# Altium footprint library Relay.PcbLib: 60 footprints (part 2 of 4)
Each footprint in its own frame and in the unit in brackets; x right, y up, seen from the top. Pads: shape width x height; smd on the part's side, far side on the other; paste and mask are expansions set on the pad; w line width, h text height; cw(c..) or ccw(c..) is an arc to the next point about the centre after c.
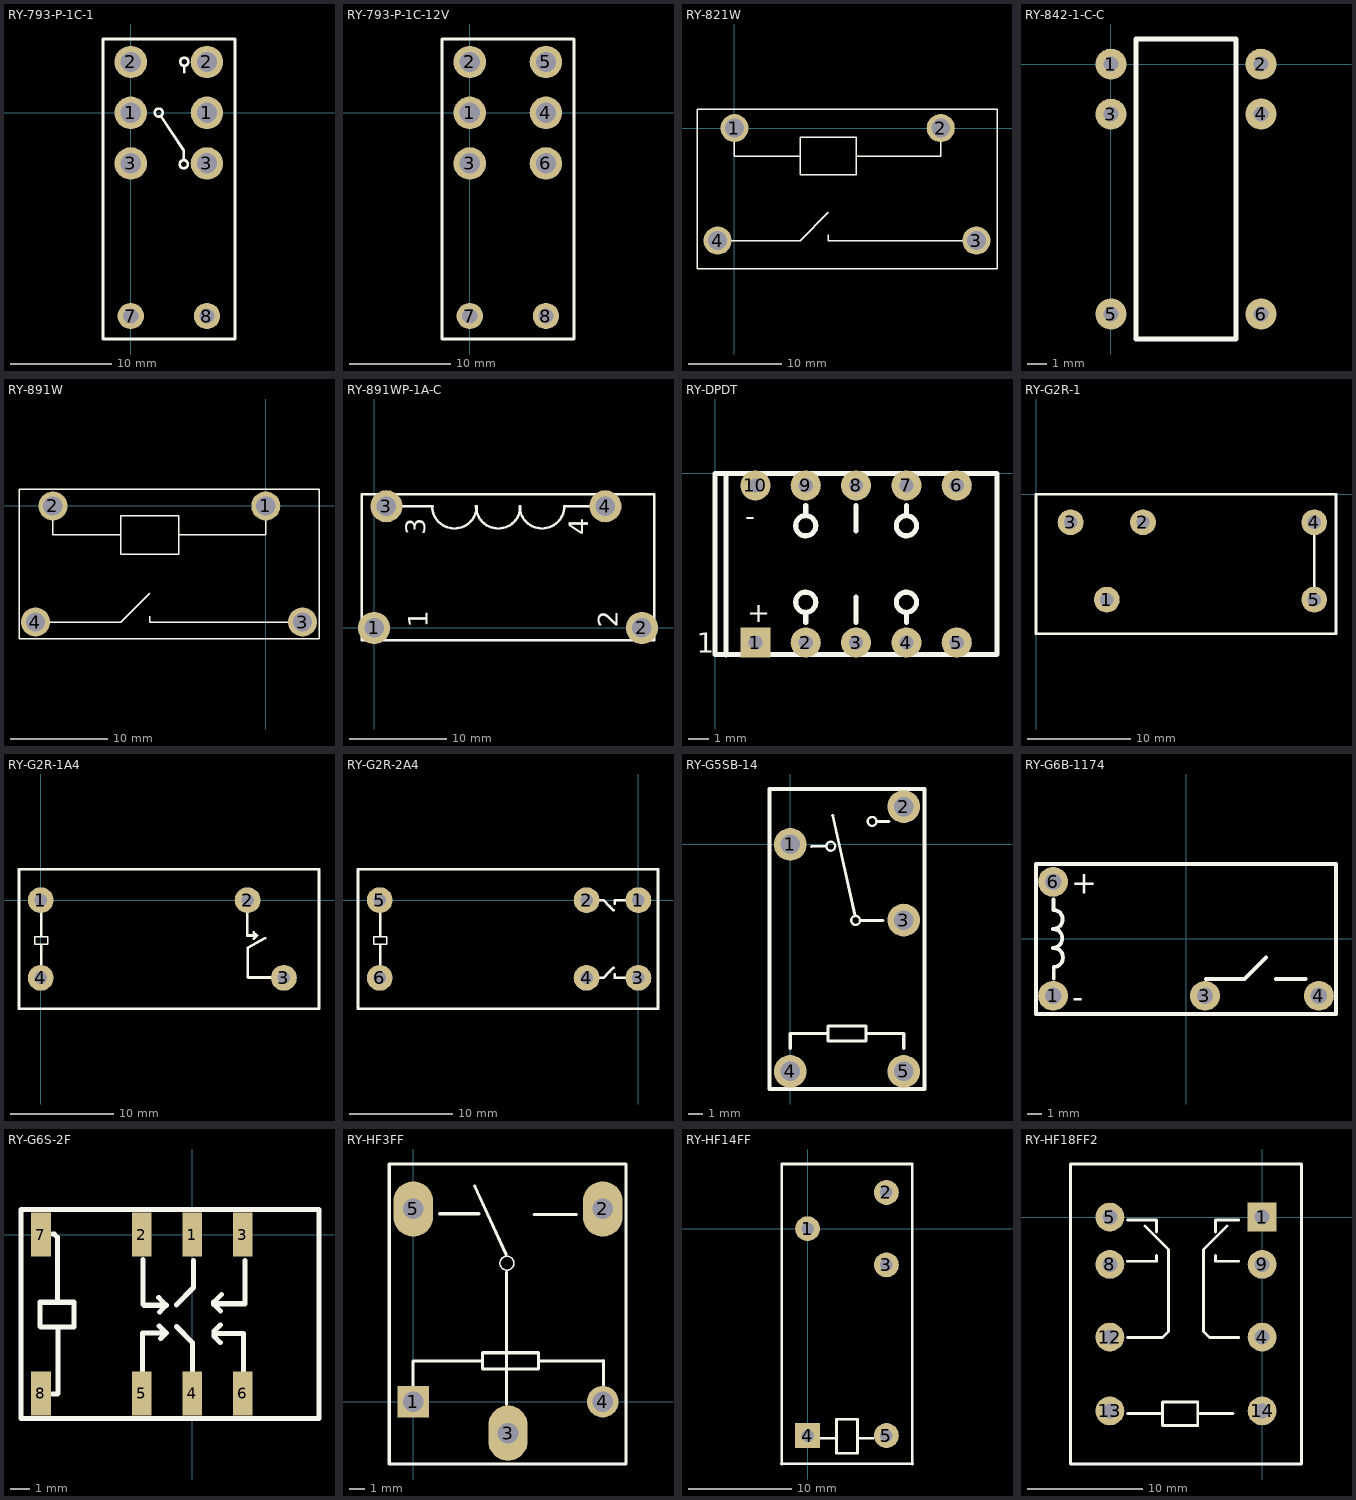
[diagram p1: the footprints below, top view; thin cyan lines are the x and y axes]

## RY-793-P-1C-1 [mil]
pads (8):
  round 126 hole 79: 1(0,0) 1(295,0) 2(0,197) 2(295,197) 3(0,-196) 3(295,-196)
  round 102 hole 59: 7(0,-787) 8(295,-787)
Top Overlay:
  circle w10: c205.35,-199 r15.65
  circle w10: c108.35,1 r15.65
  circle w10: c207.35,198 r15.65
  lines w10: 119,-16 205,-146 205,-176 ; 207,157 207,178
  lines w12: -108,-876 404,-876 404,286 -108,286 -108,-876

## RY-793-P-1C-12V [mil]
pads (8):
  round 126 hole 79: 1(0,0) 2(0,197) 3(0,-196) 4(295,0) 5(295,197) 6(295,-196)
  round 102 hole 59: 7(0,-787) 8(295,-787)
Top Overlay:
  lines w12: -108,-876 -108,286 404,286 404,-876 -108,-876

## RY-821W [mm]
pads (4):
  round 3 hole 2: 1(0,0) 2(22,0) 3(25.8,-12) 4(-1.8,-12)
Top Overlay:
  lines w0.15: -1.8,-12 7,-12 10,-9 ; 0,0 0,-3 7,-3 ; 10,-11.4 10,-12 25.8,-12 ; 13,-3 22,-3 22,0 ; 7,-3 7,-1 13,-1 13,-5 7,-5 7,-3 ; -4,-15 28,-15 28,2 -4,2 -4,-15

## RY-842-1-C-C [mil]
pads (6):
  round 62 hole 30: 1(0,0) 2(300,0) 3(0,-100) 4(300.3,-99.7) 5(0.3,-499.7) 6(300.3,-499.7)
Top Overlay:
  lines w10: 50.3,-549.7 50.3,50.3 250.3,50.3 250.3,-549.7 50.3,-549.7

## RY-891W [mm]
pads (4):
  round 3 hole 2: 1(0,0) 2(-22,0) 3(3.8,-12) 4(-23.8,-12)
Top Overlay:
  lines w0.15: -23.8,-12 -15,-12 -12,-9 ; -22,0 -22,-3 -15,-3 ; -12,-11.4 -12,-12 3.8,-12 ; -9,-3 0,-3 0,0 ; -15,-3 -15,-1 -9,-1 -9,-5 -15,-5 -15,-3 ; -25.5,-13.75 5.5,-13.75 5.5,1.75 -25.5,1.75 -25.5,-13.75

## RY-891WP-1A-C [mil]
pads (4):
  round 130 hole 79: 1(0,0) 2(1083,0) 3(50,492) 4(935,492)
Top Overlay:
  lines w10: 50,492 237,492 ; 235,492 ccw(c325,492) 415,492 ; 412,492 ccw(c502,492) 592,492 ; 589,492 ccw(c679,492) 769,492 ; 768,492 935,492 ; -49,-49 -49,541 1132,541 1132,-49 -49,-49
  text "3" at 207,374 h79
  text "4" at 866,374 h79
  text "1" at 217,0 h79
  text "2" at 985,0 h79

## RY-DPDT [mm]
pads (10):
  rect 1.5x1.5 hole 0.7: 1(2,-8.4)
  round 1.5 hole 0.7: 2(4.5,-8.4) 3(7,-8.4) 4(9.5,-8.4) 5(12,-8.4) 6(12,-0.6) 7(9.5,-0.6) 8(7,-0.6) 9(4.5,-0.6) 10(2,-0.6)
Top Overlay:
  circle w0.254: c4.5,-2.6 r0.5
  circle w0.254: c9.5,-2.6 r0.5
  circle w0.254: c4.5,-6.4 r0.5
  circle w0.254: c9.5,-6.4 r0.5
  lines w0.254: 0.533,-9.017 0.533,-0.025 ; 4.5,-7.4 4.5,-6.9 ; 4.5,-2.1 4.5,-1.6 ; 7,-7.4 7,-6.15 ; 7,-2.85 7,-1.6 ; 9.5,-7.4 9.5,-6.9 ; 9.5,-2.1 9.5,-1.6 ; 0,-9 0,0 14,0 14,-9 0,-9
  text "+" at 1.6,-7.4 h1
  text "-" at 1.5,-2.6 h1
  text "1" at -0.9,-8.9 h1
3D body: height 5, standoff 0, extent 0,-9 14,0

## RY-G2R-1 [mm]
pads (5):
  round 2.5 hole 1.3: 1(6.858,-10.211) 2(10.363,-2.718) 3(3.353,-2.718) 4(26.949,-2.718) 5(26.949,-10.211)
Top Overlay:
  lines w0.254: 26.949,-10.211 26.949,-2.718 ; 0,-13.513 0,0 29.058,0 29.058,-13.513 0,-13.513
3D body "relay_g2rk-1_48dc.stp": height 25.5, standoff -4, extent 0.079,-13.583 29.08,-0.083

## RY-G2R-1A4 [mm]
pads (4):
  round 2.5 hole 1.2: 1(0,0) 2(20,0) 3(23.5,-7.5) 4(0,-7.5)
Top Overlay:
  lines w0.127: 0.059,-5.395 0.059,-4.277 ; 0.059,-3.515 0.059,-2.855 ; -0.601,-4.277 0.669,-4.277 0.669,-3.515 -0.601,-3.515 -0.601,-4.277
  lines w0.254: 0.059,-7.441 0.059,-4.556 ; 0.059,-4.785 0.059,-4.353 ; 0.059,-3.439 0.059,-2.855 0.059,-0.059 ; 19.976,0.025 19.976,-2.959 19.976,-3.417 20.909,-3.417 ; 20.582,-3.744 20.909,-3.417 ; 20.582,-3.109 20.89,-3.417 20.909,-3.417 ; 21.674,-3.667 19.998,-4.607 19.998,-7.427 20.046,-7.475 23.476,-7.475 ; -2.1,-10.5 -2.1,3 26.9,3 26.9,-10.5 -2.1,-10.5

## RY-G2R-2A4 [mm]
pads (6):
  round 2.5 hole 1.2: 1(0,0) 2(-5,0) 3(0,-7.5) 4(-5,-7.5) 5(-25,0) 6(-25,-7.5)
Top Overlay:
  lines w0.127: -24.941,-5.395 -24.941,-4.277 ; -24.941,-3.515 -24.941,-2.855 ; -25.601,-4.277 -24.331,-4.277 -24.331,-3.515 -25.601,-3.515 -25.601,-4.277
  lines w0.254: -24.941,-7.441 -24.941,-4.556 ; -24.941,-4.785 -24.941,-4.353 ; -24.941,-3.439 -24.941,-2.855 -24.941,-0.059 ; -5,-7.5 -3.361,-7.5 -2.767,-6.906 -2.386,-6.525 ; -5,0 -3.361,0 -2.767,-0.594 -2.386,-0.975 ; -2.274,-7.15 -2.274,-7.5 0,-7.5 ; -2.274,-0.35 -2.274,0 0,0 ; -27.1,-10.5 -27.1,3 1.9,3 1.9,-10.5 -27.1,-10.5

## RY-G5SB-14 [mm]
pads (5):
  round 2.2 hole 1.3: 1(0,0) 2(7.62,2.54) 3(7.62,-5.08) 4(0,-15.24) 5(7.62,-15.24)
Top Overlay:
  circle w0.15: c4.391,-5.102 r0.3
  circle w0.15: c5.496,1.542 r0.3
  circle w0.15: c2.717,-0.122 r0.3
  lines w0.203: 0,-13.716 0,-12.7 2.54,-12.7 ; 1.439,-0.126 2.417,-0.122 ; 2.854,1.935 4.351,-4.779 ; 4.691,-5.102 6.215,-5.102 ; 5.08,-12.7 7.62,-12.7 7.62,-13.716 ; 5.796,1.542 6.627,1.539 ; 2.54,-13.208 3.556,-13.208 5.08,-13.208 5.08,-12.192 2.54,-12.192 2.54,-13.208
  lines w0.254: -1.39,-16.42 9.01,-16.42 9.01,3.72 -1.39,3.72 -1.39,-16.42

## RY-G6B-1174 [mm]
pads (4):
  round 2 hole 1.1: 1(-8.89,-3.81) 3(1.27,-3.81) 4(8.89,-3.81) 6(-8.89,3.81)
Top Overlay:
  lines w0.254: -8.915,-0.61 ccw(c-8.915,0.025) -8.28,0.025 -8.28,0.051 ccw(c-8.89,0.051) -8.89,0.66 ccw(c-8.89,1.295) -8.255,1.295 -8.255,1.321 ccw(c-8.865,1.321) -8.865,1.93 -8.865,2.642 ; -8.865,-0.61 cw(c-8.865,-1.245) -8.23,-1.245 -8.23,-1.27 cw(c-8.839,-1.27) -8.839,-1.88 -8.839,-2.667 ; 1.346,-2.692 3.912,-2.692 5.359,-1.245 ; 6.02,-2.692 8.001,-2.692 ; -10.033,-5.029 10.033,-5.029 10.033,5.004 -10.033,5.004 -10.033,-5.029
  text "+" at -7.671,3.023 h1.52
  text "-" at -7.62,-4.648 h1.52
3D body "g6b-1114p-us_5dc.stp": height 10, standoff -3.2, extent -10.474,-5 10.526,5

## RY-G6S-2F [mm]
pads (8):
  rect 1x2.2 smd: 1(0,0) 2(-2.54,0) 3(2.54,0) 4(0,-8) 5(-2.54,-8) 6(2.54,-8) 7(-7.62,0) 8(-7.62,-8)
Top Overlay:
  lines w0.254: -7.045,-8.031 -6.791,-8.031 -6.766,-8.005 -6.766,-7.548 -6.766,-4.653 ; -7.045,0.021 -6.944,0.021 -6.791,-0.131 -6.791,-3.357 ; -2.499,-6.862 -2.499,-4.957 -1.305,-4.957 ; -2.473,-1.249 -2.473,-3.51 -2.422,-3.56 -1.305,-3.56 ; -1.686,-3.179 -1.305,-3.56 ; -1.66,-4.602 -1.305,-4.957 ; -1.635,-3.891 -1.305,-3.56 ; -1.584,-5.237 -1.305,-4.957 ; -0.797,-4.627 0.016,-5.44 0.016,-6.862 ; -0.797,-3.535 0.067,-2.671 0.067,-1.3 ; 1.413,-5.44 1.108,-5.135 1.108,-4.983 ; 1.413,-4.551 1.108,-4.856 1.108,-4.983 ; 1.413,-3.84 1.083,-3.51 1.083,-3.484 ; 1.464,-3.027 1.083,-3.408 1.083,-3.484 ; 2.581,-6.862 2.581,-4.983 1.108,-4.983 ; 2.658,-1.3 2.658,-3.484 1.083,-3.484 ; -8.62,-9.25 6.38,-9.25 6.38,1.25 -8.62,1.25 -8.62,-9.25 ; -7.655,-4.627 -7.629,-4.653 -5.953,-4.653 -5.953,-3.408 -7.655,-3.408 -7.655,-4.627

## RY-HF3FF [mm]
pads (5):
  rect 2x2 hole 1.3: 1(0,0)
  oval 2.5x3.5 hole 1.3: 2(12,12.2) 3(6,-2) 5(0,12.2)
  round 2 hole 1.3: 4(12,0)
Top Overlay:
  circle w0.1: c5.93,8.765 r0.443
  lines w0.2: -0.022,1.027 -0.022,2.551 ; -0.008,2.58 4.38,2.582 ; 1.657,11.9 4.169,11.897 ; 3.896,13.649 5.883,9.325 ; 5.897,-0.19 5.897,8.205 ; 7.66,11.844 10.319,11.844 ; 7.936,2.582 12.04,2.58 ; 12.054,1.069 12.054,2.593 ; 13.476,15.034 13.476,-3.952 -1.524,-3.952 -1.524,15.048 13.476,15.048 ; 4.38,2.074 4.38,3.09 7.936,3.09 7.936,2.074 4.38,2.074

## RY-HF14FF [mm]
pads (5):
  round 2.4 hole 1.2: 1(0,0) 2(7.62,3.5) 3(7.62,-3.5) 5(7.62,-20)
  rect 2.4x2.4 hole 1.2: 4(0,-20)
Top Overlay:
  lines w0.254: -2.54,-22.728 10.16,-22.728 ; -2.49,-22.75 -2.49,6.25 10.11,6.25 10.11,-22.75 ; 1.27,-20.254 2.794,-20.254 ; 4.826,-20.254 6.35,-20.254 ; 2.794,-21.712 2.794,-18.41 4.826,-18.41 4.826,-21.712 2.794,-21.712

## RY-HF18FF2 [mm]
pads (8):
  rect 2.5x2.5 hole 1.3: 1(0,0)
  round 2.5 hole 1.3: 4(0,-10.4) 5(-13.2,0) 8(-13.2,-4.1) 9(0,-4.1) 12(-13.2,-10.4) 13(-13.2,-16.8) 14(0,-16.8)
Top Overlay:
  lines w0.254: -11.68,-17.036 -8.632,-17.036 ; -11.68,-10.432 -8.632,-10.432 -8.124,-9.924 -8.124,-2.812 -10.156,-0.78 ; -11.68,-3.828 -10.156,-3.828 -9.14,-3.828 -9.14,-3.32 ; -11.68,-0.272 -10.156,-0.272 -9.14,-0.272 -9.14,-1.288 ; -5.584,-17.036 -2.536,-17.036 ; -4.06,-3.32 -4.06,-3.828 -3.552,-3.828 -2.028,-3.828 ; -4.06,-1.288 -4.06,-0.272 -3.552,-0.272 -2.028,-0.272 ; -3.044,-0.78 -5.076,-2.812 -5.076,-9.924 -4.568,-10.432 -2.028,-10.432 ; -16.6,-21.4 3.4,-21.4 3.4,4.6 -16.6,4.6 -16.6,-21.4 ; -8.632,-18.052 -5.584,-18.052 -5.584,-16.02 -8.632,-16.02 -8.632,-18.052